# Altium footprint library ACTION_Connector.PcbLib: 138 footprints (part 2 of 9)
Each footprint in its own frame and in the unit in brackets; x right, y up, seen from the top. Pads: shape width x height; smd on the part's side, far side on the other; paste and mask are expansions set on the pad; w line width, h text height; cw(c..) or ccw(c..) is an arc to the next point about the centre after c.
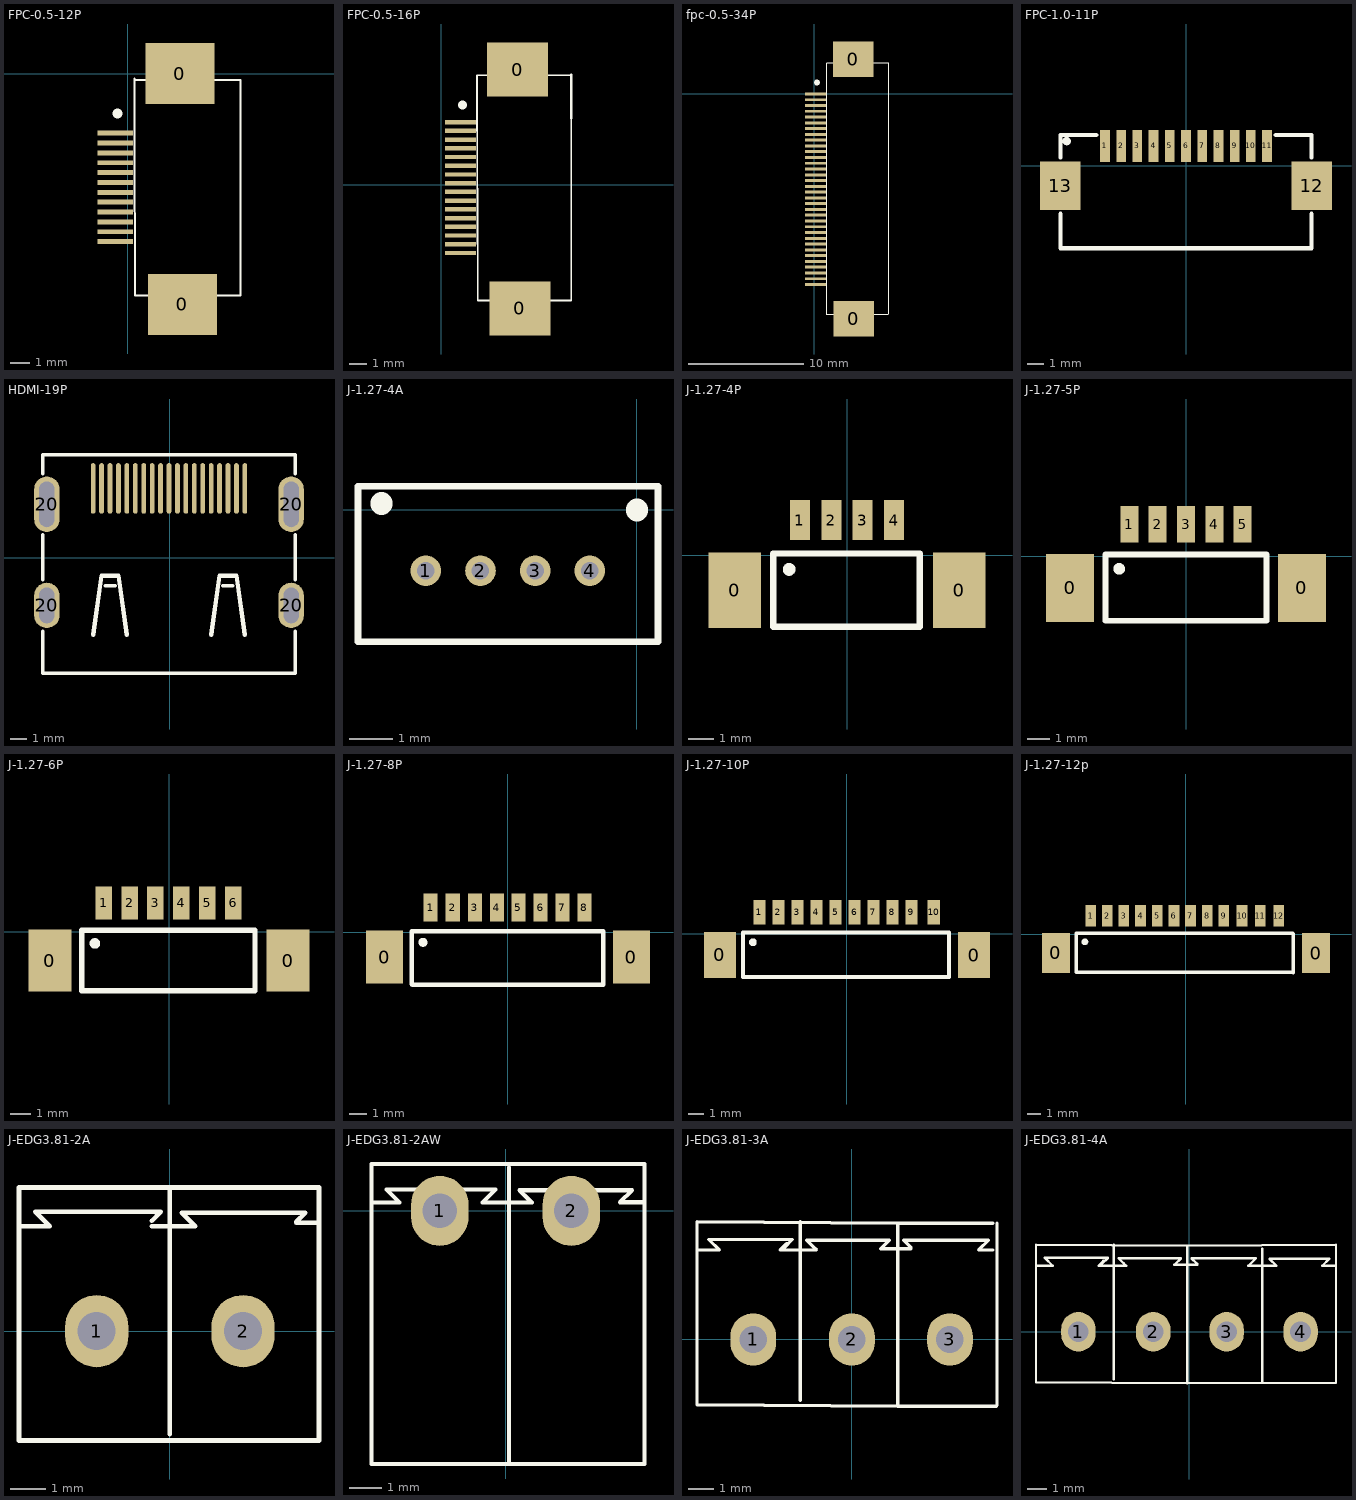
[diagram p1: the footprints below, top view; thin cyan lines are the x and y axes]

## FPC-0.5-12P [mm]
pads (14):
  rect 3.5x3.1 smd: 0(2.642,0) 0(2.769,-11.709)
  rect 1.8x0.25 smd: 1(-0.635,-3.023) 2(-0.635,-3.523) 3(-0.635,-4.023) 4(-0.635,-4.523) 5(-0.635,-5.023) 6(-0.635,-5.523) 7(-0.635,-6.023) 8(-0.635,-6.523) 9(-0.635,-7.023) 10(-0.635,-7.523) 11(-0.635,-8.023) 12(-0.635,-8.523)
Top Overlay:
  lines w0.1: 0.33,-2.972 0.33,-0.254 ; 0.33,-2.819 0.355,-11.252 5.715,-11.252 5.715,-0.33 0.33,-0.33
  lines w0.5: -0.533,-2.032 -0.508,-2.032
3D body "1-1734839-2.stp": height 2.02, standoff -0.03, extent 0.082,-11.455 5.192,-0.025

## FPC-0.5-16P [mm]
pads (18):
  rect 3.5x3.1 smd: 0(4.369,6.599) 0(4.496,-7.112)
  rect 1.8x0.25 smd: 1(1.092,3.576) 2(1.092,3.076) 3(1.092,2.576) 4(1.092,2.076) 5(1.092,1.576) 6(1.092,1.076) 7(1.092,0.576) 8(1.092,0.076) 9(1.092,-0.424) 10(1.092,-0.925) 11(1.092,-1.425) 12(1.092,-1.925) 13(1.092,-2.425) 14(1.092,-2.925) 15(1.092,-3.425) 16(1.092,-3.925)
Top Overlay:
  lines w0.1: 2.044,6.274 2.082,-6.655 7.442,-6.655 7.442,4.267 ; 2.057,6.269 7.442,6.269
  lines w0.127: 7.442,3.8 7.442,6.294
  lines w0.5: 1.194,4.567 1.219,4.567
3D body "FPC-12pin.stp": height 2.07, standoff -0.03, extent 1.676,-7.428 6.776,7.072

## fpc-0.5-34P [mm]
pads (36):
  rect 3.5x3.1 smd: 0(3.378,2.997) 0(3.404,-19.533)
  rect 1.8x0.25 smd: 1(0.102,-0.025) 2(0.102,-0.525) 3(0.102,-1.025) 4(0.102,-1.525) 5(0.102,-2.025) 6(0.102,-2.525) 7(0.102,-3.025) 8(0.102,-3.525) 9(0.102,-4.025) 10(0.102,-4.525) 11(0.102,-5.025) 12(0.102,-5.525) 13(0.102,-6.039) 14(0.102,-6.539) 15(0.102,-7.039) 16(0.102,-7.539) 17(0.102,-8.039) 18(0.102,-8.539) 19(0.102,-9.039) 20(0.102,-9.539) 21(0.102,-10.039) 22(0.102,-10.539) 23(0.102,-11.039) 24(0.102,-11.539) 25(0.101,-12.051) 26(0.101,-12.551) 27(0.101,-13.051) 28(0.101,-13.551) 29(0.101,-14.051) 30(0.101,-14.551) 31(0.101,-15.051) 32(0.101,-15.551) 33(0.101,-16.051) 34(0.101,-16.551)
Top Overlay:
  lines w0.1: 1.041,-19.152 6.426,-19.152 ; 1.067,-19.075 1.067,0.178 ; 1.067,0.025 1.067,2.642 ; 1.067,2.667 6.452,2.667 6.452,-19.101
  lines w0.5: 0.203,0.965 0.229,0.965
3D body "FPC34-0.5MM.stp": height 1.97, standoff -0.08, extent 0.508,-19.495 5.618,2.935

## FPC-1.0-11P [mm]
pads (13):
  rect 0.6x2 smd: 1(-5,1.225) 2(-4,1.225) 3(-3,1.225) 4(-2,1.225) 5(-1,1.225) 6(0,1.225) 7(1,1.225) 8(2,1.225) 9(3,1.225) 10(4,1.225) 11(5,1.225)
  rect 2.5x3 smd: 12(7.75,-1.225) 13(-7.75,-1.225)
Top Overlay:
  circle w0.254: c-7.359,1.524 r0.127
  lines w0.254: -7.74,-2.956 -7.74,-5.08 7.74,-5.08 7.74,-2.956 ; -7.74,0.506 -7.74,1.905 -5.531,1.905 ; 5.531,1.905 7.74,1.905 7.74,0.506
3D body "70372696.stp": height 3, standoff 0, extent -9,-6.7 9,2

## HDMI-19P [mm]
pads (23):
  oval 0.28x3 smd: 1(4.465,4.101) 2(3.964,4.101) 3(3.464,4.101) 4(2.964,4.101) 5(2.463,4.101) 6(1.963,4.101) 7(1.465,4.101) 8(0.965,4.101) 9(0.464,4.101) 10(-0.036,4.101) 11(-0.537,4.101) 12(-1.037,4.101) 13(-1.535,4.101) 14(-2.035,4.101) 15(-2.536,4.101) 16(-3.036,4.101) 17(-3.536,4.101) 18(-4.037,4.101) 19(-4.537,4.101)
  oval 1.5x2.699 hole 0.9 slot 2.1 at 90 deg copper offset -0.001,-0.001: 20(-7.286,-2.836)
  oval 1.5x3.299 hole 0.9 slot 2.7 at 90 deg copper offset -0.001,-0.001: 20(-7.286,3.164)
  oval 1.5x2.699 hole 0.9 slot 2.1 at 90 deg copper offset 0.001,-0.001: 20(7.214,-2.836)
  oval 1.5x3.299 hole 0.9 slot 2.7 at 90 deg copper offset 0.001,-0.001: 20(7.214,3.164)
Top Overlay:
  lines w0.2: -7.536,-4.356 -7.536,-6.858 7.464,-6.858 7.464,-4.356 ; -7.536,-1.315 -7.536,1.344 ; -7.536,4.985 -7.536,6.096 7.464,6.096 7.464,4.984 ; -3.836,-1.676 -3.236,-1.676 ; 3.164,-1.676 3.764,-1.676 ; 7.464,-1.315 7.464,1.344
  lines w0.254: -4.536,-4.577 -4.036,-1.077 -3.036,-1.077 -2.536,-4.577 ; 2.464,-4.577 2.964,-1.077 3.964,-1.077 4.464,-4.577
3D body "1939411_1747981-1.stp": height 6.28, standoff -2, extent -7.55,-6.95 7.45,5.05

## J-1.27-4A [mm]
pads (4):
  round 0.7 hole 0.4: 1(-4.826,-1.397) 2(-3.576,-1.397) 3(-2.326,-1.397) 4(-1.076,-1.397)
Top Overlay:
  lines w0.152: -6.375,-3.023 0.483,-3.023 0.483,0.533 -6.375,0.533 -6.375,-3.023
  lines w0.5: -5.842,0.127 -5.842,0.152 ; 0,-0.025 0,0

## J-1.27-4P [mm]
height 0.6
pads (6):
  rect 2.1x3 smd: 0(-4.475,-1.401) 0(4.475,-1.401)
  rect 0.8x1.6 smd: 1(-1.875,1.401) 2(-0.625,1.401) 3(0.625,1.401) 4(1.875,1.401)
Top Overlay:
  circle w0.254: c-2.305,-0.566 r0.127
  lines w0.254: -2.94,-2.852 2.902,-2.852 2.902,0.069 -2.94,0.069 -2.94,-2.852
3D body "装配体3(1).STEP": height 3.67, standoff 0.02, extent -4.993,-3.599 5.057,2.101

## J-1.27-5P [mm]
pads (7):
  rect 2.1x3 smd: 0(-5.117,-1.399) 0(5.117,-1.402)
  rect 0.8x1.6 smd: 1(-2.5,1.402) 2(-1.25,1.402) 3(0,1.402) 4(1.25,1.402) 5(2.5,1.402)
Top Overlay:
  circle w0.254: c-2.947,-0.564 r0.127
  lines w0.254: -3.556,-2.85 -3.556,0.071 3.556,0.071 3.556,-2.85 -3.556,-2.85
3D body "71072016.stp": height 3.4, standoff -0.01, extent -5.5,-3.397 5.5,2.013

## J-1.27-6P [mm]
pads (8):
  rect 2.1x3 smd: 0(-5.759,-1.399) 0(5.759,-1.402)
  rect 0.8x1.6 smd: 1(-3.159,1.402) 2(-1.909,1.402) 3(-0.659,1.402) 4(0.591,1.402) 5(1.856,1.402) 6(3.106,1.402)
Top Overlay:
  circle w0.254: c-3.589,-0.564 r0.127
  lines w0.254: -4.224,-2.85 4.158,-2.85 4.158,0.071 -4.224,0.071 -4.224,-2.85
3D body "CH1.25-6P-SMD.STEP": height 3.5, standoff 0, extent -6.612,-3.468 6.038,1.732

## J-1.27-8P [mm]
pads (10):
  rect 2.1x3 smd: 0(-6.972,-1.399) 0(6.972,-1.402)
  rect 0.8x1.6 smd: 1(-4.371,1.402) 2(-3.121,1.402) 3(-1.871,1.402) 4(-0.622,1.402) 5(0.592,1.402) 6(1.842,1.402) 7(3.069,1.402) 8(4.319,1.402)
Top Overlay:
  circle w0.254: c-4.801,-0.564 r0.127
  lines w0.254: -5.436,-2.928 -5.436,0.069 5.371,0.069 5.371,-2.954 -5.411,-2.954 -5.436,-2.928
3D body "CH1.25-8P-SMD.STEP": height 3.5, standoff 0, extent -7.779,-3.699 7.371,1.501

## J-1.27-10P [mm]
pads (12):
  rect 2.1x3 smd: 0(-8.36,-1.4) 0(8.36,-1.403)
  rect 0.8x1.6 smd: 1(-5.76,1.401) 2(-4.51,1.401) 3(-3.26,1.401) 4(-2.01,1.401) 5(-0.754,1.403) 6(0.495,1.403) 7(1.733,1.401) 8(2.983,1.401) 9(4.233,1.401) 10(5.699,1.403)
Top Overlay:
  circle w0.254: c-6.19,-0.565 r0.127
  lines w0.254: 6.696,-2.851 -6.825,-2.851 -6.825,0.07 6.706,0.07 ; 6.709,-2.851 6.709,0.07

## J-1.27-12p [mm]
height 0.6
pads (14):
  rect 2.1x3 smd: 0(-9.76,-1.4) 0(9.76,-1.403)
  rect 0.8x1.6 smd: 1(-7.16,1.401) 2(-5.91,1.401) 3(-4.66,1.401) 4(-3.41,1.401) 5(-2.154,1.403) 6(-0.905,1.403) 7(0.333,1.401) 8(1.583,1.401) 9(2.833,1.401) 10(4.209,1.403) 11(5.583,1.401) 12(6.959,1.403)
Top Overlay:
  circle w0.254: c-7.59,-0.565 r0.127
  lines w0.254: 8.016,0.07 -8.225,0.07 -8.225,-2.851 8.036,-2.851 ; 8.046,-2.87 8.046,0.051

## J-EDG3.81-2A [mil]
pads (2):
  oval 70x80 hole 42: 1(-81,0) 2(81,0)
Top Overlay:
  lines w5: -167,116 -133,116 -149,132 -10,132 -20,122 ; -20,116 16,116 28,116 23,121 13,131 150,131 140,121 140,120 164,120 ; 0,-114 0,159 ; -167,-121 -167,159 165,159 165,-121 -167,-121
3D body "小绿头2.STEP": height 354.33, standoff -137.8, extent -168,-122 166.65,158

## J-EDG3.81-2AW [mil]
height 68.9
pads (2):
  oval 70x85 hole 42: 1(-80,0) 2(80,0)
Top Overlay:
  lines w5: -163,10 -129,10 -145,26 -12,26 -28,10 32,10 27,15 17,25 154,25 139.5,10.5 167.5,10.5 ; 4,-305 4,53 ; -163,-308 -163,57 169,57 169,-308 -163,-308
3D body "66361.stp": height 287.4, standoff -102.36, extent -173.99,-305.55 180.74,56.66

## J-EDG3.81-3A [mil]
pads (3):
  oval 70x80 hole 42: 1(-151,0) 2(0,0) 3(150,0)
Top Overlay:
  lines w5: -237,137 -203,137 -219,153 -104,153 -91,153 -103,141 ; -97.22,146.78 -100.22,146.78 -110,137 -90,137 -54,137 -59,142 -69,152 57,152 44,139 90,139 90,141 79,152 209,152 194,137 216,137 ; -79,-93 -79,180 ; 70,141 70,142 ; 216,178 70,178 ; 221,-102 70,-102 ; 222,-101 222,172 222,178 ; 70,-102 70,178 ; 70,-102 -237,-100 -237,180 70,178
3D body "3-3.81修改.STEP": height 354.33, standoff -118.11, extent -250.99,-109.56 238.99,193

## J-EDG3.81-4A [mil]
pads (4):
  oval 70x80 hole 42: 1(-225.5,0) 2(-73.5,0) 3(75.5,0) 4(225.5,0)
Top Overlay:
  lines w5: -311.5,134 -277.5,134 -293.5,150 -178.5,150 -165.5,150 -177.5,138 ; -171.72,143.78 -174.72,143.78 -184.5,134 -164.5,134 -128.5,134 -133.5,139 -143.5,149 -17.5,149 -30.5,136 15.5,136 15.5,138 4.5,149 134.5,149 119.5,134 176.5,134 162.5,148 283.5,148 269.5,134 297.5,134 ; -153.5,-96 -153.5,177 ; -4.5,138 -4.5,139 ; 147.5,-104 147.5,169 ; -4.5,-105 -4.5,175 ; -4.5,-105 -311.5,-103 -311.5,177 -4.5,175 ; -4.5,-105 297.5,-103.31 297.5,176.69 -4.5,175